# Altium footprint library Elettronica FM.PcbLib: 387 footprints (part 2 of 25)
Each footprint in its own frame and in the unit in brackets; x right, y up, seen from the top. Pads: shape width x height; smd on the part's side, far side on the other; paste and mask are expansions set on the pad; w line width, h text height; cw(c..) or ccw(c..) is an arc to the next point about the centre after c.
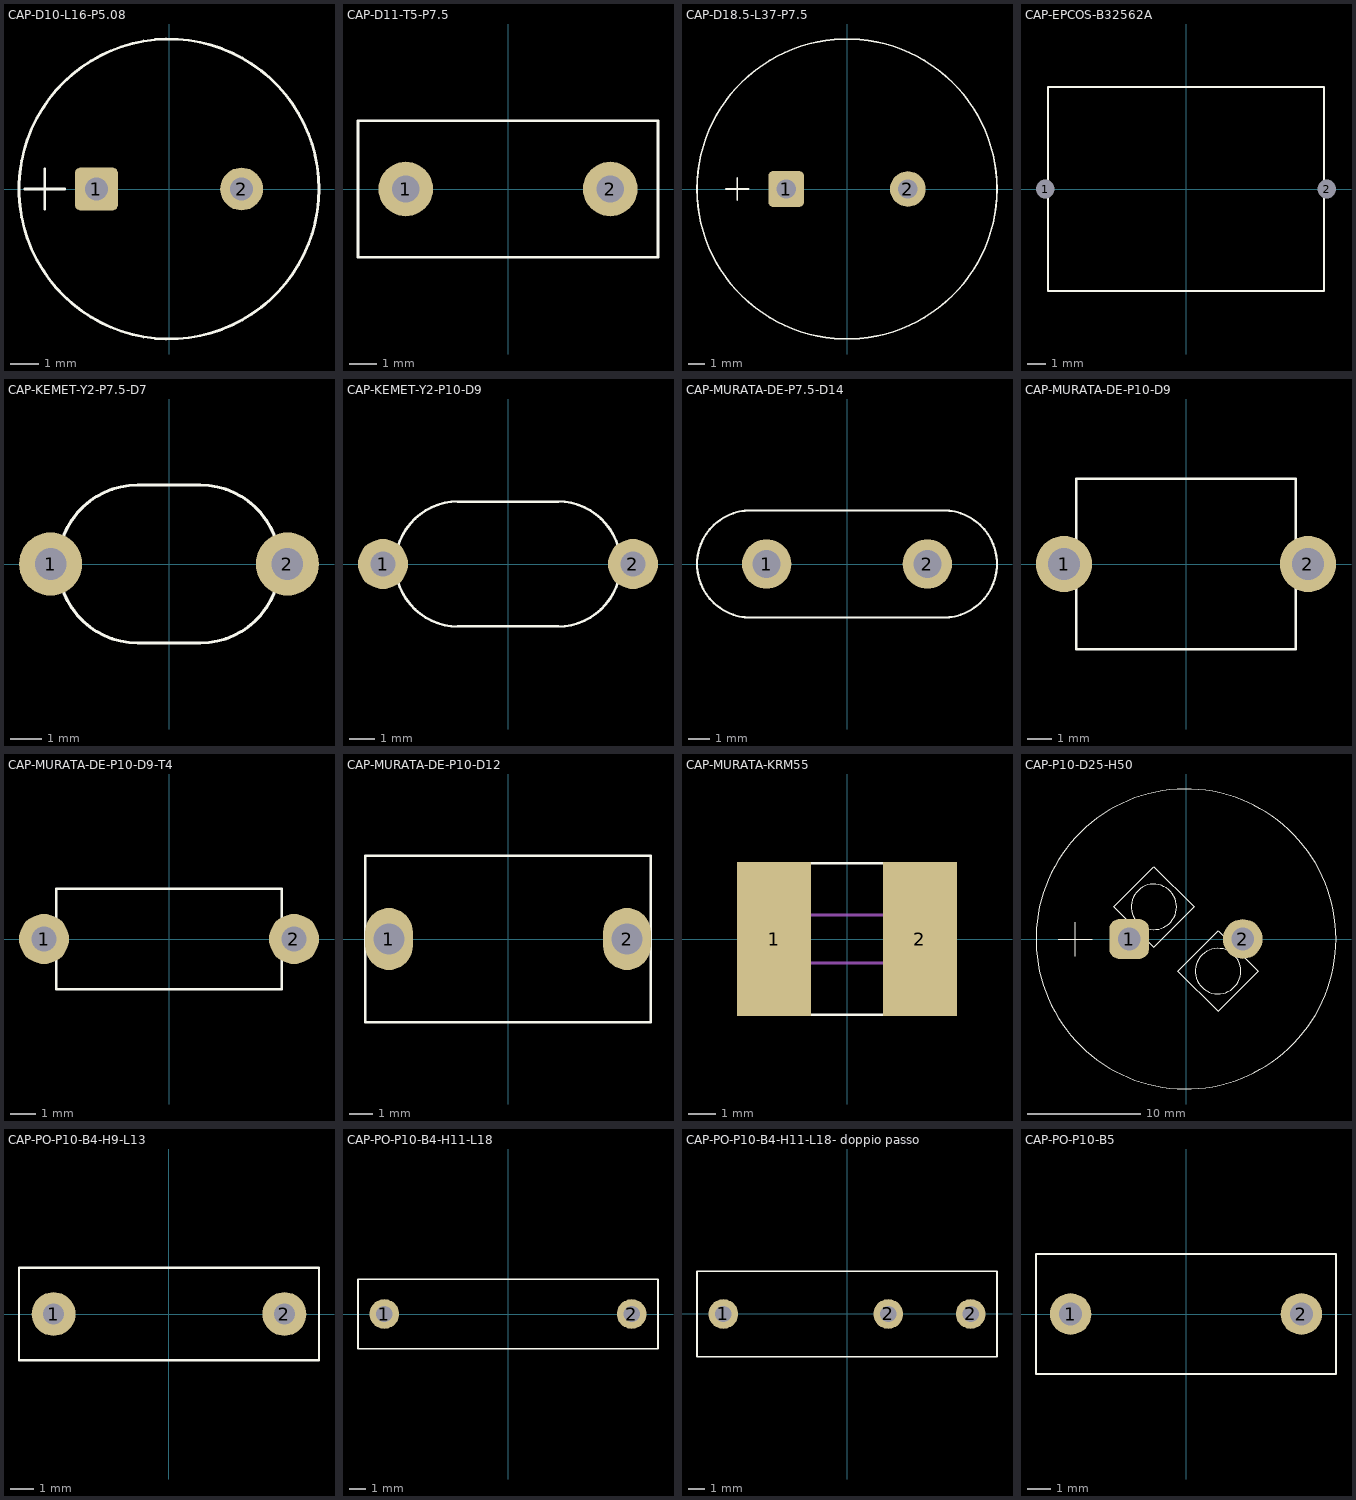
[diagram p1: the footprints below, top view; thin cyan lines are the x and y axes]

## CAP-D10-L16-P5.08 [mm]
pads (2):
  rrect25% 1.5x1.5 hole 0.8: 1(-2.54,0)
  round 1.5 hole 0.8: 2(2.54,0)
Top Overlay:
  circle w0.1: c0,0 r5.25
  lines w0.1: -5.05,0 -3.65,0 ; -4.35,-0.7 -4.35,0.7
3D body: height 17.5, standoff 0, extent -5.25,-5.247 5.25,5.247

## CAP-D11-T5-P7.5 [mm]
pads (2):
  round 2 hole 1: 1(-3.75,0) 2(3.75,0)
Top Overlay:
  lines w0.1: -5.5,-2.5 5.5,-2.5 5.5,2.5 -5.5,2.5 -5.5,-2.5
3D body: height 6, standoff 0, extent 3.105,-0.649 4.4,0.649
3D body: height 6, standoff 0, extent -4.395,-0.649 -3.1,0.649
3D body: height 15, standoff 4, extent -5.5,-2.5 5.5,2.5

## CAP-D18.5-L37-P7.5 [mm]
pads (2):
  rrect25% 2.2x2.2 hole 1.2: 1(-3.75,0)
  round 2.2 hole 1.2: 2(3.75,0)
Top Overlay:
  circle w0.1: c0,0 r9.25
  lines w0.1: -7.475,0 -6.075,0 ; -6.775,-0.7 -6.775,0.7
3D body: height 37, standoff 0, extent -9.25,-9.245 9.25,9.245

## CAP-EPCOS-B32562A [mm]
pads (2):
  round 0.8 / inner round 2 / far side round 2.6 hole 1: 1(-7.6,0) 2(7.6,0)
Top Overlay:
  lines w0.1: -7.45,-5.5 -7.45,5.5 7.45,5.5 7.45,-5.5 -7.45,-5.5
3D body: height 1.25, standoff 0, extent -7.45,-5.5 7.45,5.5

## CAP-KEMET-Y2-P7.5-D7 [mm]
pads (2):
  round 2 hole 1: 1(-3.75,0) 2(3.75,0)
Top Overlay:
  lines w0.1: -1,-2.5 cw(c-1,0) -1,2.5 1,2.5 cw(c1,0) 1,-2.5 -1,-2.5
3D body: height 10, standoff 3, extent -3.5,-2.5 3.5,2.5

## CAP-KEMET-Y2-P10-D9 [mm]
pads (2):
  round 2 hole 1: 1(-5,0) 2(5,0)
Top Overlay:
  lines w0.1: -2,-2.5 cw(c-2,0) -2,2.5 2,2.5 cw(c2,0) 2,-2.5 -2,-2.5
3D body: height 12, standoff 3, extent -4.5,-2.5 4.5,2.5

## CAP-MURATA-DE-P7.5-D14 [mm]
pads (2):
  round 2.3 hole 1.3: 1(-3.75,0) 2(3.75,0)
Top Overlay:
  lines w0.1: -4.5,-2.502 cw(c-4.5,0) -4.5,2.502 ; -4.5,-2.5 4.5,-2.5 ; -4.5,2.5 4.5,2.5 ; 4.5,-2.502 ccw(c4.5,0) 4.5,2.502
3D body: height 14.5, standoff 0.5, extent -7,-2.5 7,2.5

## CAP-MURATA-DE-P10-D9 [mm]
pads (2):
  round 2.3 hole 1.3: 1(-5,0) 2(5,0)
Top Overlay:
  lines w0.1: -4.5,-3.5 4.5,-3.5 4.5,3.5 -4.5,3.5 -4.5,-3.5
3D body: height 12, standoff 3, extent -4.5,-3.5 4.5,3.5

## CAP-MURATA-DE-P10-D9-T4 [mm]
pads (2):
  round 2 hole 1: 1(-5,0) 2(5,0)
Top Overlay:
  lines w0.1: -4.5,-2 -4.5,2 4.5,2 4.5,-2 -4.5,-2
3D body: height 12, standoff 3, extent -4.5,-2 4.5,2

## CAP-MURATA-DE-P10-D12 [mm]
pads (2):
  oval 2x2.6 hole 1.3: 1(-5,0) 2(5,0)
Top Overlay:
  lines w0.1: -6,-3.5 -6,3.5 6,3.5 6,-3.5 -6,-3.5
3D body: height 13.5, standoff 1.5, extent -6,-3.5 6,3.5

## CAP-MURATA-KRM55 [mm]
height 1.9
pads (2):
  rect 2.7x5.6 smd paste-0.1 mask+0.1: 1(-2.65,0) 2(2.65,0)
Top Overlay:
  lines w0.1: -3.45,-2.75 -3.45,2.75 3.45,2.75 3.45,-2.75 -3.45,-2.75
Mechanical 3:
  lines w0.1: -1.65,-0.875 1.65,-0.875 1.65,0.875 -1.65,0.875 -1.65,-0.875
3D body: height 5, standoff 0, extent -3.45,-2.75 3.475,2.75

## CAP-P10-D25-H50 [mm]
pads (2):
  rrect50% 3.5x3.5 hole 2: 1(-5,0)
  round 3.5 hole 2: 2(5,0)
Top Overlay:
  circle w0.1: c2.828,-2.828 r2
  circle w0.1: c-2.828,2.828 r2
  circle w0.1: c0,0 r13.2
  lines w0.1: -11.25,-0.025 -8.25,-0.025 ; -9.75,-1.525 -9.75,1.475 ; -6.364,2.828 -2.828,6.364 0.707,2.828 -2.828,-0.707 -6.364,2.828 ; -0.707,-2.828 2.828,-6.364 6.364,-2.828 2.828,0.707 -0.707,-2.828
3D body: height 52.5, standoff 0, extent -13.2,-13.193 13.2,13.193

## CAP-PO-P10-B4-H9-L13 [mm]
height 8.5
pads (2):
  round 1.9 hole 0.9: 1(-5,0) 2(5,0)
Top Overlay:
  lines w0.1: -6.5,-2 -6.5,2 6.5,2 6.5,-2 -6.5,-2
3D body: height 9, standoff 0, extent -6.5,-2 6.5,2

## CAP-PO-P10-B4-H11-L18 [mm]
height 8.5
pads (2):
  round 1.8 hole 1: 1(-7.5,0) 2(7.5,0)
Top Overlay:
  lines w0.1: -9.1,-2.1 9.1,-2.1 9.1,2.1 -9.1,2.1 -9.1,-2.1
3D body: height 11.1, standoff 0, extent -9.1,-2.1 9.1,2.1

## CAP-PO-P10-B4-H11-L18- doppio passo [mm]
height 8.5
pads (3):
  round 1.8 hole 1: 1(-7.5,0) 2(2.5,0) 2(7.5,0)
Top Overlay:
  lines w0.1: -9.1,-2.6 9.1,-2.6 9.1,2.6 -9.1,2.6 -9.1,-2.6
3D body: height 11.1, standoff 0, extent -9.1,-2.6 9.1,2.6

## CAP-PO-P10-B5 [mm]
height 8.5
pads (2):
  round 1.8 hole 1: 1(-5,0) 2(5,0)
Top Overlay:
  lines w0.1: -6.5,-2.6 6.5,-2.6 6.5,2.6 -6.5,2.6 -6.5,-2.6